# Altium footprint library BBC_Footprints.PcbLib: 172 footprints (part 8 of 11)
Each footprint in its own frame and in the unit in brackets; x right, y up, seen from the top. Pads: shape width x height; smd on the part's side, far side on the other; paste and mask are expansions set on the pad; w line width, h text height; cw(c..) or ccw(c..) is an arc to the next point about the centre after c.
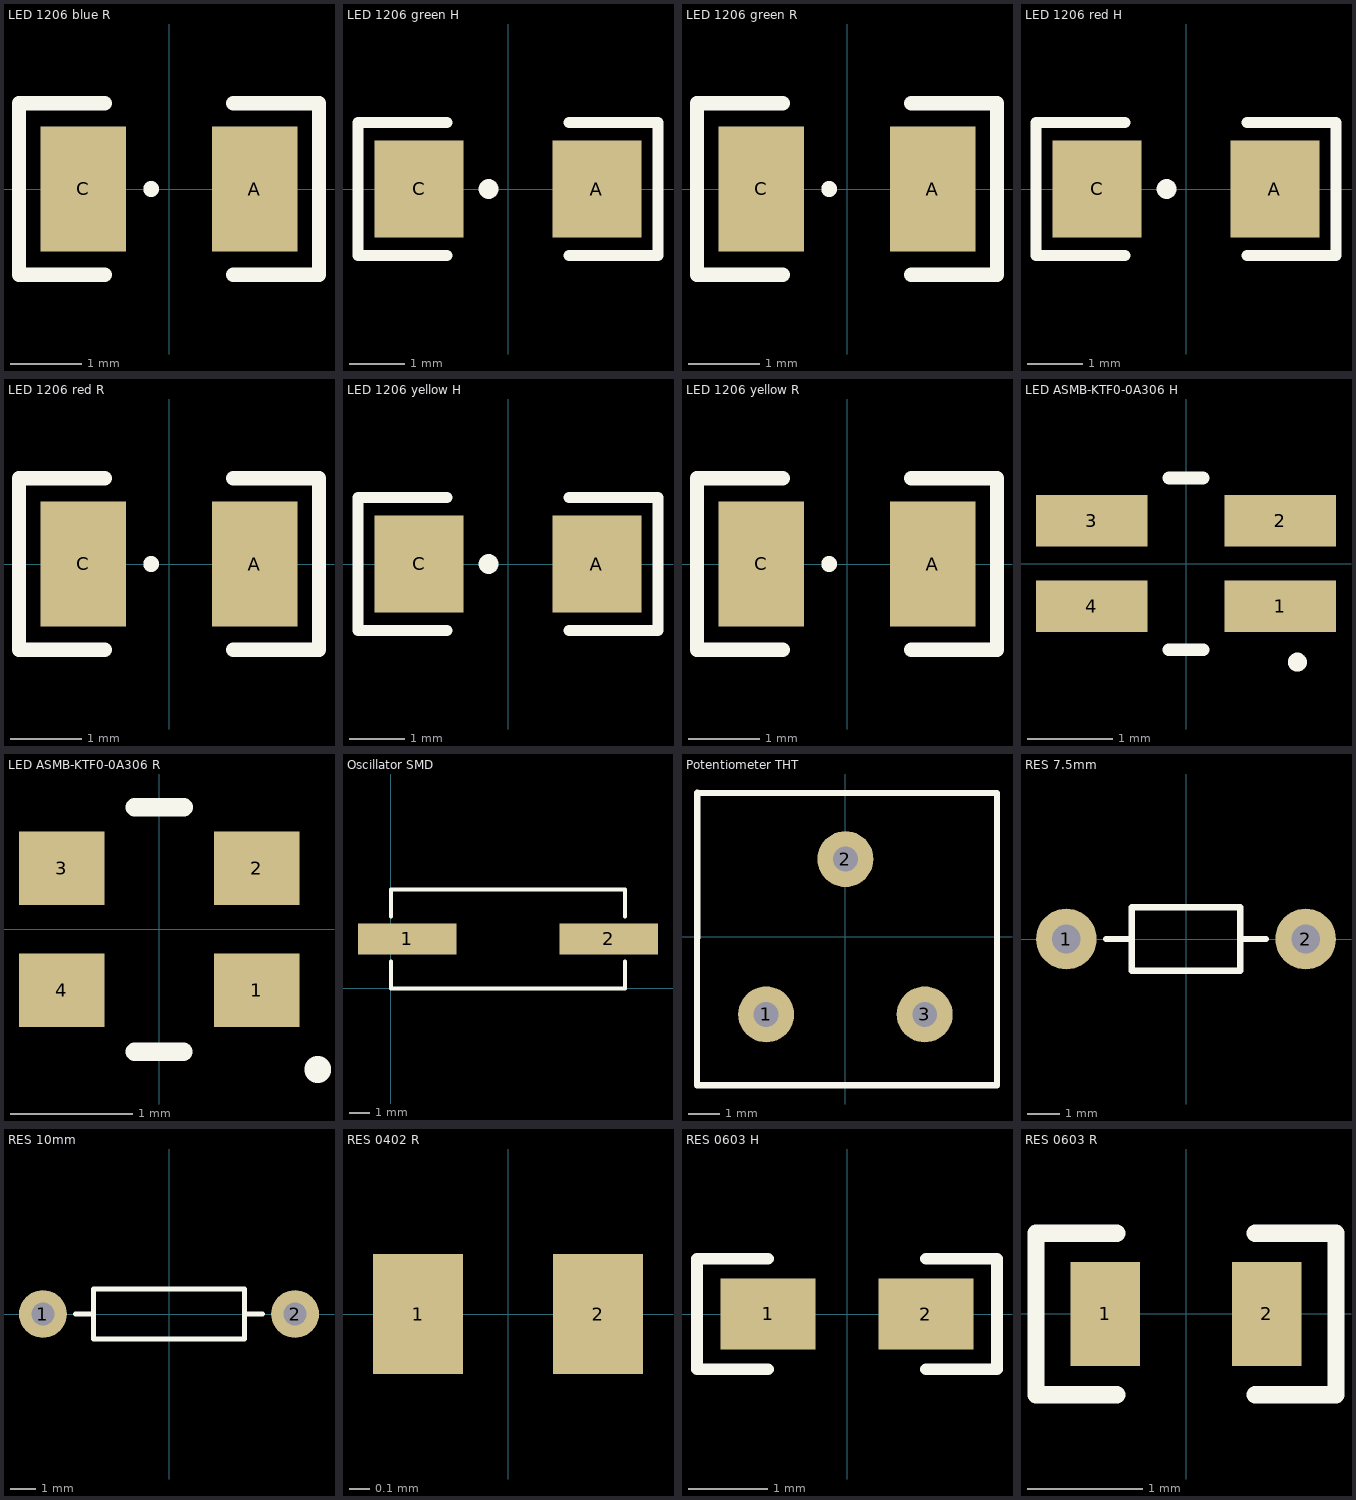
[diagram p7: the footprints below, top view; thin cyan lines are the x and y axes]

## LED 1206 blue R [mm] "SMD LED for reflow soldering"
height 2
pads (2):
  rect 1.2x1.75 smd: A(1.2,0) C(-1.2,0)
Top Overlay:
  circle w0.2: c-0.25,0 r0.01
  lines w0.2: -0.9,-1.2 -2.1,-1.2 -2.1,1.2 -0.9,1.2 ; 0.9,-1.2 2.1,-1.2 2.1,1.2 0.9,1.2
3D body "LED 1206 blue.step": height 1.1, standoff 0, extent -1.6,-0.8 1.6,0.8

## LED 1206 green H [mm] "SMD LED for hand soldering"
height 2
pads (2):
  rect 1.6x1.75 smd: A(1.6,0) C(-1.6,0)
Top Overlay:
  circle w0.254: c-0.35,0 r0.05
  lines w0.2: -1.1,-1.2 -2.7,-1.2 -2.7,1.2 -1.1,1.2 ; 1.1,-1.2 2.7,-1.2 2.7,1.2 1.1,1.2
3D body "LED 1206 green.step": height 1.1, standoff 0, extent -1.6,-0.8 1.6,0.8

## LED 1206 green R [mm] "SMD LED for reflow soldering"
height 2
pads (2):
  rect 1.2x1.75 smd: A(1.2,0) C(-1.2,0)
Top Overlay:
  circle w0.2: c-0.25,0 r0.01
  lines w0.2: -0.9,-1.2 -2.1,-1.2 -2.1,1.2 -0.9,1.2 ; 0.9,-1.2 2.1,-1.2 2.1,1.2 0.9,1.2
3D body "LED 1206 green.step": height 1.1, standoff 0, extent -1.6,-0.8 1.6,0.8

## LED 1206 red H [mm] "SMD LED"
height 2
pads (2):
  rect 1.6x1.75 smd: A(1.6,0) C(-1.6,0)
Top Overlay:
  circle w0.254: c-0.35,0 r0.05
  lines w0.2: -1.1,-1.2 -2.7,-1.2 -2.7,1.2 -1.1,1.2 ; 1.1,-1.2 2.7,-1.2 2.7,1.2 1.1,1.2
3D body "LED 1206 red.step": height 1.1, standoff 0, extent -1.6,-0.8 1.6,0.8

## LED 1206 red R [mm] "SMD LED for reflow soldering"
height 2
pads (2):
  rect 1.2x1.75 smd: A(1.2,0) C(-1.2,0)
Top Overlay:
  circle w0.2: c-0.25,0 r0.01
  lines w0.2: -0.9,-1.2 -2.1,-1.2 -2.1,1.2 -0.9,1.2 ; 0.9,-1.2 2.1,-1.2 2.1,1.2 0.9,1.2
3D body "LED 1206 red.step": height 1.1, standoff 0, extent -1.6,-0.8 1.6,0.8

## LED 1206 yellow H [mm] "SMD LED for hand soldering"
height 2
pads (2):
  rect 1.6x1.75 smd: A(1.6,0) C(-1.6,0)
Top Overlay:
  circle w0.254: c-0.35,0 r0.05
  lines w0.2: -1.1,-1.2 -2.7,-1.2 -2.7,1.2 -1.1,1.2 ; 1.1,-1.2 2.7,-1.2 2.7,1.2 1.1,1.2
3D body "LED 1206 yellow.step": height 1.1, standoff 0, extent -1.6,-0.8 1.6,0.8

## LED 1206 yellow R [mm] "SMD LED for reflow soldering"
height 2
pads (2):
  rect 1.2x1.75 smd: A(1.2,0) C(-1.2,0)
Top Overlay:
  circle w0.2: c-0.25,0 r0.01
  lines w0.2: -0.9,-1.2 -2.1,-1.2 -2.1,1.2 -0.9,1.2 ; 0.9,-1.2 2.1,-1.2 2.1,1.2 0.9,1.2
3D body "LED 1206 yellow.step": height 1.1, standoff 0, extent -1.6,-0.8 1.6,0.8

## LED ASMB-KTF0-0A306 H [mm] "ASMB-KTF0-0A306  SMD RGB LED for hand soldering"
height 1.9
pads (4):
  rect 1.3x0.6 smd: 1(1.1,-0.5) 2(1.1,0.5) 3(-1.1,0.5) 4(-1.1,-0.5)
Top Overlay:
  circle w0.2: c1.3,-1.15 r0.01
  lines w0.15: -0.201,-1.006 0.199,-1.006 ; -0.2,1 0.2,1
3D body "LED ASMB-KTF0-0A306.STEP": height 1.9, standoff -0.05, extent -1.105,-1 1.105,1

## LED ASMB-KTF0-0A306 R [mm] "ASMB-KTF0-0A306  SMD RGB LED for reflow soldering"
height 1.9
pads (4):
  rect 0.7x0.6 smd: 1(0.8,-0.5) 2(0.8,0.5) 3(-0.8,0.5) 4(-0.8,-0.5)
Top Overlay:
  circle w0.2: c1.3,-1.15 r0.01
  lines w0.15: -0.201,-1.006 0.199,-1.006 ; -0.2,1 0.2,1
3D body "LED ASMB-KTF0-0A306.STEP": height 1.9, standoff -0.05, extent -1.105,-1 1.105,1

## Oscillator SMD [mm]
pads (2):
  rect 4.8x1.5 smd: 1(0.8,2.4) 2(10.6,2.4)
Top Overlay:
  lines w0.2: 0,1.3 0,0 11.4,0 11.4,1.3 ; 0,3.5 0,4.8 11.4,4.8 11.4,3.5
3D body "User Library-Crystal HC49_US-SM.step": height 4.3, standoff 0, extent -0.685,-0.002 12.115,4.828

## Potentiometer THT [mm]
pads (3):
  round 1.8 hole 0.8: 1(-2.55,-2.5) 2(0,2.5) 3(2.55,-2.5)
Top Overlay:
  lines w0.2: -4.775,-4.775 4.875,-4.775 4.875,4.625 -4.765,4.63 -4.775,-4.775
3D body "PotiVishay.step": height 10.41, standoff -4.78, extent -4.7,-4.76 4.82,4.76

## RES 7.5mm [mm] "resistor for tht mounting with a 7.5mm pitch"
height 3
pads (2):
  round 1.9 hole 0.9: 1(-3.75,0) 2(3.75,0)
Top Overlay:
  lines w0.2: -2.5,0 -1.7,0 ; 1.7,0 2.5,0 ; -1.7,-1 -1.7,1 1.7,1 1.7,-1 -1.7,-1
3D body "RES THT 7.5mm.step": height 2.41, standoff -2, extent -4.11,-1.2 4.11,1.2

## RES 10mm [mm] "resistor for tht mounting with a 10mm pitch"
height 3
pads (2):
  round 1.9 hole 0.9: 1(-5,0) 2(5,0)
Top Overlay:
  lines w0.2: -3.7,0 -3,0 ; 3,0 3.7,0 ; -3,-1 3,-1 3,1 -3,1 -3,-1
3D body "RES THT 10mm.step": height 2.41, standoff -2, extent -5.38,-1.2 5.38,1.2

## RES 0402 R [mm] "0402 resistor for reflow soldering"
pads (2):
  rect 0.45x0.6 smd: 1(-0.45,0) 2(0.45,0)
3D body "RES 0402.step": height 0.41, standoff 0, extent -0.575,-0.275 0.575,0.275

## RES 0603 H [mm] "0603 resistor for hand soldering"
pads (2):
  rect 1.2x0.9 smd: 1(-1,0) 2(1,0)
Top Overlay:
  lines w0.15: -1,-0.7 -1.9,-0.7 -1.9,0.7 -1,0.7 ; 1,-0.7 1.9,-0.7 1.9,0.7 1,0.7
3D body "RES 0603.step": height 0.56, standoff 0, extent -0.85,-0.4 0.85,0.4

## RES 0603 R [mm] "0603 resistor for reflow soldering"
pads (2):
  rect 0.6x0.9 smd: 1(-0.7,0) 2(0.7,0)
Top Overlay:
  lines w0.15: -0.6,-0.7 -1.3,-0.7 -1.3,0.7 -0.6,0.7 ; 0.6,-0.7 1.3,-0.7 1.3,0.7 0.6,0.7
3D body "RES 0603.step": height 0.56, standoff 0, extent -0.85,-0.4 0.85,0.4